# Altium footprint library Connectors SMD.PcbLib: 130 footprints (part 5 of 12) (continued)
## PANASONIC_AYF315115 [mm] "51 Contacts, Pitch 0.3mm, Surface Mount, FPC for FPC Connection, YF31 Serie"
height 0.91
pads (53):
  rect 0.3x0.7 smd: 1(-7.5,-1.15) 3(-6.9,-1.15) 5(-6.3,-1.15) 7(-5.7,-1.15) 9(-5.1,-1.15) 11(-4.5,-1.15) 13(-3.9,-1.15) 15(-3.3,-1.15) 17(-2.7,-1.15) 19(-2.1,-1.15) 21(-1.5,-1.15) 23(-0.9,-1.15) 25(-0.3,-1.15) 27(0.3,-1.15) 29(0.9,-1.15) 31(1.5,-1.15) 33(2.1,-1.15) 35(2.7,-1.15) 37(3.3,-1.15) 39(3.9,-1.15) 41(4.5,-1.15) 43(5.1,-1.15) 45(5.7,-1.15) 47(6.3,-1.15) 49(6.9,-1.15) 51(7.5,-1.15)
  rect 0.3x0.5 smd: 2(-7.2,1.45) 4(-6.6,1.45) 6(-6,1.45) 8(-5.4,1.45) 10(-4.8,1.45) 12(-4.2,1.45) 14(-3.6,1.45) 16(-3,1.45) 18(-2.4,1.45) 20(-1.8,1.45) 22(-1.2,1.45) 24(-0.6,1.45) 26(0,1.45) 28(0.6,1.45) 30(1.2,1.45) 32(1.8,1.45) 34(2.4,1.45) 36(3,1.45) 38(3.6,1.45) 40(4.2,1.45) 42(4.8,1.45) 44(5.4,1.45) 46(6,1.45) 48(6.6,1.45) 50(7.2,1.45)
  rect 0.45x1 smd: 52(8.2,-0.9) 53(-8.2,-0.9)
Top Overlay:
  drawing of 215 lines, arcs and shapes, not listed
Mechanical 8:
  drawing of 269 lines, arcs and shapes, not listed
Mechanical 14:
  drawing of 250 lines, arcs and shapes, not listed
Mechanical 15:
  lines w0.05: -8.925,-1.85 8.925,-1.85 8.925,1.95 -8.925,1.95 -8.925,-1.85
3D body: height 0.9, standoff 0, extent -8.675,-1.6 8.675,1.6

## PCI Express x1 [mm] "36 contacts Board Eddge PCI Express x1 Connector"
pads (36):
  rect 0.7x3.2 smd far side paste-0.4: A1(0.65,4)
  rect 0.7x4 smd far side paste-0.4: A2(1.65,3.6) A3(2.65,3.6) A4(3.65,3.6) A5(4.65,3.6) A6(5.65,3.6) A7(6.65,3.6) A8(7.65,3.6) A9(8.65,3.6) A10(9.65,3.6) A11(10.65,3.6) A12(13.65,3.6) A13(14.65,3.6) A14(15.65,3.6) A15(16.65,3.6) A16(17.65,3.6) A17(18.65,3.6) A18(19.65,3.6)
  rect 0.7x4 smd paste-0.4: B1(0.65,3.6) B2(1.65,3.6) B3(2.65,3.6) B4(3.65,3.6) B5(4.65,3.6) B6(5.65,3.6) B7(6.65,3.6) B8(7.65,3.6) B9(8.65,3.6) B10(9.65,3.6) B11(10.65,3.6) B12(13.65,3.6) B13(14.65,3.6) B14(15.65,3.6) B15(16.65,3.6) B16(17.65,3.6) B18(19.65,3.6)
  rect 0.7x3.2 smd paste-0.4: B17(18.65,4)
Top Overlay:
  text "B18" at 19.989,6.096 h0.76
  text "B12" at 13.989,6.096 h0.76
  text "B11" at 10.889,6.096 h0.76
  text "B1" at 0.889,6.096 h0.76
Bottom Overlay:
  text "A18" at 19.151,6.02 h0.76
  text "A12" at 13.151,6.02 h0.76
  text "A11" at 10.051,6.02 h0.76
  text "A1" at 0.051,6.02 h0.76
Mechanical 8:
  drawing of 164 lines, arcs and shapes, not listed

## PCI Express x4 [mm] "64 contacts Board Eddge PCI Express x4 Connector"
pads (64):
  rect 0.7x3.2 smd far side paste-0.4: A1(0.65,4)
  rect 0.7x4 smd far side paste-0.4: A2(1.65,3.6) A3(2.65,3.6) A4(3.65,3.6) A5(4.65,3.6) A6(5.65,3.6) A7(6.65,3.6) A8(7.65,3.6) A9(8.65,3.6) A10(9.65,3.6) A11(10.65,3.6) A12(13.65,3.6) A13(14.65,3.6) A14(15.65,3.6) A15(16.65,3.6) A16(17.65,3.6) A17(18.65,3.6) A18(19.65,3.6) A19(20.65,3.6) A20(21.65,3.6) A21(22.65,3.6) A22(23.65,3.601) A23(24.65,3.601) A24(25.65,3.601) A25(26.65,3.601) A26(27.65,3.601) A27(28.65,3.601) A28(29.65,3.601) A29(30.65,3.602) A30(31.65,3.602) A31(32.65,3.602) A32(33.65,3.602)
  rect 0.7x4 smd paste-0.4: B1(0.65,3.6) B2(1.65,3.6) B3(2.65,3.6) B4(3.65,3.6) B5(4.65,3.6) B6(5.65,3.6) B7(6.65,3.6) B8(7.65,3.6) B9(8.65,3.6) B10(9.65,3.6) B11(10.65,3.6) B12(13.65,3.6) B13(14.65,3.6) B14(15.65,3.6) B15(16.65,3.6) B16(17.65,3.6) B18(19.65,3.6) B19(20.65,3.6) B20(21.65,3.6) B21(22.65,3.6) B22(23.65,3.601) B23(24.65,3.601) B24(25.65,3.601) B25(26.65,3.601) B26(27.65,3.601) B27(28.65,3.601) B28(29.65,3.601) B29(30.65,3.602) B30(31.65,3.602) B32(33.65,3.602)
  rect 0.7x3.2 smd paste-0.4: B17(18.65,4) B31(32.65,4.002)
Top Overlay:
  text "B1" at 0.889,6.096 h0.76
  text "B11" at 10.889,6.096 h0.76
  text "B12" at 13.989,6.096 h0.76
  text "B18" at 19.989,6.096 h0.76
  text "B32" at 33.989,6.098 h0.76
Bottom Overlay:
  text "A1" at 0.051,6.02 h0.76
  text "A11" at 10.051,6.02 h0.76
  text "A12" at 13.151,6.02 h0.76
  text "A18" at 19.151,6.02 h0.76
  text "A32" at 33.151,6.022 h0.76
Mechanical 8:
  drawing of 280 lines, arcs and shapes, not listed

## PCI Express x8 [mm] "98 contacts Board Eddge PCI Express x8 Connector"
pads (98):
  rect 0.7x3.2 smd far side paste-0.4: A1(0.65,4)
  rect 0.7x4 smd far side paste-0.4: A2(1.65,3.6) A3(2.65,3.6) A4(3.65,3.6) A5(4.65,3.6) A6(5.65,3.6) A7(6.65,3.6) A8(7.65,3.6) A9(8.65,3.6) A10(9.65,3.6) A11(10.65,3.6) A12(13.65,3.6) A13(14.65,3.6) A14(15.65,3.6) A15(16.65,3.6) A16(17.65,3.6) A17(18.65,3.6) A18(19.65,3.6) A19(20.65,3.6) A20(21.65,3.6) A21(22.65,3.6) A22(23.65,3.601) A23(24.65,3.601) A24(25.65,3.601) A25(26.65,3.601) A26(27.65,3.601) A27(28.65,3.601) A28(29.65,3.601) A29(30.65,3.602) A30(31.65,3.602) A31(32.65,3.602) A32(33.65,3.602) A33(34.65,3.602) A34(35.65,3.602) A35(36.65,3.602) A36(37.65,3.602) A37(38.65,3.602) A38(39.65,3.602) A39(40.65,3.602) A40(41.65,3.602) A41(42.65,3.602) A42(43.65,3.602) A43(44.65,3.602) A44(45.65,3.602) A45(46.65,3.602) A46(47.65,3.602) A47(48.65,3.602) A48(49.65,3.602) A49(50.65,3.602)
  rect 0.7x4 smd paste-0.4: B1(0.65,3.6) B2(1.65,3.6) B3(2.65,3.6) B4(3.65,3.6) B5(4.65,3.6) B6(5.65,3.6) B7(6.65,3.6) B8(7.65,3.6) B9(8.65,3.6) B10(9.65,3.6) B11(10.65,3.6) B12(13.65,3.6) B13(14.65,3.6) B14(15.65,3.6) B15(16.65,3.6) B16(17.65,3.6) B18(19.65,3.6) B19(20.65,3.6) B20(21.65,3.6) B21(22.65,3.6) B22(23.65,3.601) B23(24.65,3.601) B24(25.65,3.601) B25(26.65,3.601) B26(27.65,3.601) B27(28.65,3.601) B28(29.65,3.601) B29(30.65,3.602) B30(31.65,3.602) B32(33.65,3.602) B33(34.65,3.602) B34(35.65,3.602) B35(36.65,3.602) B36(37.65,3.602) B37(38.65,3.602) B38(39.65,3.602) B39(40.65,3.602) B40(41.65,3.602) B41(42.65,3.602) B42(43.65,3.602) B43(44.65,3.602) B44(45.65,3.602) B45(46.65,3.602) B46(47.65,3.602) B47(48.65,3.602) B49(50.65,3.602)
  rect 0.7x3.2 smd paste-0.4: B17(18.65,4) B31(32.65,4.002) B48(49.65,4.002)
Top Overlay:
  text "B1" at 0.889,6.096 h0.76
  text "B11" at 10.889,6.096 h0.76
  text "B12" at 13.989,6.096 h0.76
  text "B18" at 19.989,6.096 h0.76
  text "B32" at 33.989,6.098 h0.76
  text "B49" at 50.989,6.098 h0.76
Bottom Overlay:
  text "A1" at 0.051,6.02 h0.76
  text "A11" at 10.051,6.02 h0.76
  text "A12" at 13.151,6.02 h0.76
  text "A18" at 19.151,6.02 h0.76
  text "A32" at 33.151,6.022 h0.76
  text "A49" at 50.151,6.022 h0.76
Mechanical 8:
  drawing of 308 lines, arcs and shapes, not listed

## PCI Express x16 [mm] "164 contacts Board Eddge PCI Express x16 Connector"
pads (164):
  rect 0.7x3.2 smd far side paste-0.4: A1(0.65,4)
  rect 0.7x4 smd far side paste-0.4: A2(1.65,3.6) A3(2.65,3.6) A4(3.65,3.6) A5(4.65,3.6) A6(5.65,3.6) A7(6.65,3.6) A8(7.65,3.6) A9(8.65,3.6) A10(9.65,3.6) A11(10.65,3.6) A12(13.65,3.6) A13(14.65,3.6) A14(15.65,3.6) A15(16.65,3.6) A16(17.65,3.6) A17(18.65,3.6) A18(19.65,3.6) A19(20.65,3.6) A20(21.65,3.6) A21(22.65,3.6) A22(23.65,3.601) A23(24.65,3.601) A24(25.65,3.601) A25(26.65,3.601) A26(27.65,3.601) A27(28.65,3.601) A28(29.65,3.601) A29(30.65,3.602) A30(31.65,3.602) A31(32.65,3.602) A32(33.65,3.602) A33(34.65,3.602) A34(35.65,3.602) A35(36.65,3.602) A36(37.65,3.602) A37(38.65,3.602) A38(39.65,3.602) A39(40.65,3.602) A40(41.65,3.602) A41(42.65,3.602) A42(43.65,3.602) A43(44.65,3.602) A44(45.65,3.602) A45(46.65,3.602) A46(47.65,3.602) A47(48.65,3.602) A48(49.65,3.602) A49(50.65,3.602) A50(51.65,3.602) A51(52.65,3.602) A52(53.65,3.602) A53(54.65,3.602) A54(55.65,3.602) A55(56.65,3.602) A56(57.65,3.602) A57(58.65,3.602) A58(59.65,3.602) A59(60.65,3.602) A60(61.65,3.602) A61(62.65,3.602) A62(63.65,3.602) A63(64.65,3.602) A64(65.65,3.602) A65(66.65,3.602) A66(67.65,3.602) A67(68.65,3.602) A68(69.65,3.602) A69(70.65,3.602) A70(71.65,3.602) A71(72.65,3.602) A72(73.65,3.602) A73(74.65,3.602) A74(75.65,3.602) A75(76.65,3.602) A76(77.65,3.602) A77(78.65,3.602) A78(79.65,3.602) A79(80.65,3.602) A80(81.65,3.602) A81(82.65,3.602) A82(83.65,3.602)
  rect 0.7x4 smd paste-0.4: B1(0.65,3.6) B2(1.65,3.6) B3(2.65,3.6) B4(3.65,3.6) B5(4.65,3.6) B6(5.65,3.6) B7(6.65,3.6) B8(7.65,3.6) B9(8.65,3.6) B10(9.65,3.6) B11(10.65,3.6) B12(13.65,3.6) B13(14.65,3.6) B14(15.65,3.6) B15(16.65,3.6) B16(17.65,3.6) B18(19.65,3.6) B19(20.65,3.6) B20(21.65,3.6) B21(22.65,3.6) B22(23.65,3.601) B23(24.65,3.601) B24(25.65,3.601) B25(26.65,3.601) B26(27.65,3.601) B27(28.65,3.601) B28(29.65,3.601) B29(30.65,3.602) B30(31.65,3.602) B32(33.65,3.602) B33(34.65,3.602) B34(35.65,3.602) B35(36.65,3.602) B36(37.65,3.602) B37(38.65,3.602) B38(39.65,3.602) B39(40.65,3.602) B40(41.65,3.602) B41(42.65,3.602) B42(43.65,3.602) B43(44.65,3.602) B44(45.65,3.602) B45(46.65,3.602) B46(47.65,3.602) B47(48.65,3.602) B49(50.65,3.602) B50(51.65,3.602) B51(52.65,3.602) B52(53.65,3.602) B53(54.65,3.602) B54(55.65,3.602) B55(56.65,3.602) B56(57.65,3.602) B57(58.65,3.602) B58(59.65,3.602) B59(60.65,3.602) B60(61.65,3.602) B61(62.65,3.602) B62(63.65,3.602) B63(64.65,3.602) B64(65.65,3.602) B65(66.65,3.602) B66(67.65,3.602) B67(68.65,3.602) B68(69.65,3.602) B69(70.65,3.602) B70(71.65,3.602) B71(72.65,3.602) B72(73.65,3.602) B73(74.65,3.602) B74(75.65,3.602) B75(76.65,3.602) B76(77.65,3.602) B77(78.65,3.602) B78(79.65,3.602) B79(80.65,3.602) B80(81.65,3.602) B82(83.65,3.602)
  rect 0.7x3.2 smd paste-0.4: B17(18.65,4) B31(32.65,4.002) B48(49.65,4.002) B81(82.65,4.002)
Top Overlay:
  text "B82" at 83.989,6.098 h0.76
  text "B49" at 50.989,6.098 h0.76
  text "B32" at 33.989,6.098 h0.76
  text "B18" at 19.989,6.096 h0.76
  text "B12" at 13.989,6.096 h0.76
  text "B11" at 10.889,6.096 h0.76
  text "B1" at 0.889,6.096 h0.76
Bottom Overlay:
  text "A82" at 83.151,6.022 h0.76
  text "A49" at 50.151,6.022 h0.76
  text "A32" at 33.151,6.022 h0.76
  text "A18" at 19.151,6.02 h0.76
  text "A12" at 13.151,6.02 h0.76
  text "A11" at 10.051,6.02 h0.76
  text "A1" at 0.051,6.02 h0.76
Mechanical 8:
  drawing of 328 lines, arcs and shapes, not listed

## SAMTEC_ASP-127797-01 [mm] "Connector VITA 57, 160 Male contacts in 4 row cdgh"
height 6.1
pads (162):
  round 1 hole 1.3 unplated mask+0.3: 1(-27.191,-3.048) 2(27.191,0)
  round 0.64 smd: c1(24.765,3.175) c2(23.495,3.175) c3(22.225,3.175) c4(20.955,3.175) c5(19.685,3.175) c6(18.415,3.175) c7(17.145,3.175) c8(15.875,3.175) c9(14.605,3.175) c10(13.335,3.175) c11(12.065,3.175) c12(10.795,3.175) c13(9.525,3.175) c14(8.255,3.175) c15(6.985,3.175) c16(5.715,3.175) c17(4.445,3.175) c18(3.175,3.175) c19(1.905,3.175) c20(0.635,3.175) c21(-0.635,3.175) c22(-1.905,3.175) c23(-3.175,3.175) c24(-4.445,3.175) c25(-5.715,3.175) c26(-6.985,3.175) c27(-8.255,3.175) c28(-9.525,3.175) c29(-10.795,3.175) c30(-12.065,3.175) c31(-13.335,3.175) c32(-14.605,3.175) c33(-15.875,3.175) c34(-17.145,3.175) c35(-18.415,3.175) c36(-19.685,3.175) c37(-20.955,3.175) c38(-22.225,3.175) c39(-23.495,3.175) c40(-24.765,3.175) d1(24.765,1.905) d2(23.495,1.905) d3(22.225,1.905) d4(20.955,1.905) d5(19.685,1.905) d6(18.415,1.905) d7(17.145,1.905) d8(15.875,1.905) d9(14.605,1.905) d10(13.335,1.905) d11(12.065,1.905) d12(10.795,1.905) d13(9.525,1.905) d14(8.255,1.905) d15(6.985,1.905) d16(5.715,1.905) d17(4.445,1.905) d18(3.175,1.905) d19(1.905,1.905) d20(0.635,1.905) d21(-0.635,1.905) d22(-1.905,1.905) d23(-3.175,1.905) d24(-4.445,1.905) d25(-5.715,1.905) d26(-6.985,1.905) d27(-8.255,1.905) d28(-9.525,1.905) d29(-10.795,1.905) d30(-12.065,1.905) d31(-13.335,1.905) d32(-14.605,1.905) d33(-15.875,1.905) d34(-17.145,1.905) d35(-18.415,1.905) d36(-19.685,1.905) d37(-20.955,1.905) d38(-22.225,1.905) d39(-23.495,1.905) d40(-24.765,1.905) g1(24.765,-1.905) g2(23.495,-1.905) g3(22.225,-1.905) g4(20.955,-1.905) g5(19.685,-1.905) g6(18.415,-1.905) g7(17.145,-1.905) g8(15.875,-1.905) g9(14.605,-1.905) g10(13.335,-1.905) g11(12.065,-1.905) g12(10.795,-1.905) g13(9.525,-1.905) g14(8.255,-1.905) g15(6.985,-1.905) g16(5.715,-1.905) g17(4.445,-1.905) g18(3.175,-1.905) g19(1.905,-1.905) g20(0.635,-1.905) g21(-0.635,-1.905) g22(-1.905,-1.905) g23(-3.175,-1.905) g24(-4.445,-1.905) g25(-5.715,-1.905) g26(-6.985,-1.905) g27(-8.255,-1.905) g28(-9.525,-1.905) g29(-10.795,-1.905) g30(-12.065,-1.905) g31(-13.335,-1.905) g32(-14.605,-1.905) g33(-15.875,-1.905) g34(-17.145,-1.905) g35(-18.415,-1.905) g36(-19.685,-1.905) g37(-20.955,-1.905) g38(-22.225,-1.905) g39(-23.495,-1.905) g40(-24.765,-1.905) h1(24.765,-3.175) h2(23.495,-3.175) h3(22.225,-3.175) h4(20.955,-3.175) h5(19.685,-3.175) h6(18.415,-3.175) h7(17.145,-3.175) h8(15.875,-3.175) h9(14.605,-3.175) h10(13.335,-3.175) h11(12.065,-3.175) h12(10.795,-3.175) h13(9.525,-3.175) h14(8.255,-3.175) h15(6.985,-3.175) h16(5.715,-3.175) h17(4.445,-3.175) h18(3.175,-3.175) h19(1.905,-3.175) h20(0.635,-3.175) h21(-0.635,-3.175) h22(-1.905,-3.175) h23(-3.175,-3.175) h24(-4.445,-3.175) h25(-5.715,-3.175) h26(-6.985,-3.175) h27(-8.255,-3.175) h28(-9.525,-3.175) h29(-10.795,-3.175) h30(-12.065,-3.175) h31(-13.335,-3.175) h32(-14.605,-3.175) h33(-15.875,-3.175) h34(-17.145,-3.175) h35(-18.415,-3.175) h36(-19.685,-3.175) h37(-20.955,-3.175) h38(-22.225,-3.175) h39(-23.495,-3.175) h40(-24.765,-3.175)
Top Overlay:
  drawing of 605 lines, arcs and shapes, not listed
  text "1" at 25.417,-8.073 h1
  text "40" at -27.305,-7.112 h1
  text "g" at 29.862,-2.231 h1
  text "h" at 29.972,-3.556 h1
  text "c" at 29.972,2.921 h1
  text "d" at 29.989,1.545 h1
Mechanical 8:
  drawing of 648 lines, arcs and shapes, not listed
Mechanical 14:
  drawing of 4433 lines, arcs and shapes, not listed
  text "1" at 25.417,-8.073 h1
  text "40" at -27.305,-7.112 h1
  text "g" at 29.862,-2.231 h1
  text "h" at 29.972,-3.556 h1
  text "d" at 29.989,1.545 h1
  text "c" at 29.972,2.921 h1
3D body: height 5.61, standoff -1.27, extent -27.889,-7.341 28.778,7.341

## SAMTEC_ASP-134486-01 [mm] "Connector VITA 57, 400 Female contacts in 10 row abcdefghj"
height 6.55
pads (402):
  round 1 hole 1.3 unplated mask+0.3: 1(-27.19,0) 2(27.19,-3.05)
  round 0.64 smd: a1(24.765,-5.715) a2(23.495,-5.715) a3(22.225,-5.715) a4(20.955,-5.715) a5(19.685,-5.715) a6(18.415,-5.715) a7(17.145,-5.715) a8(15.875,-5.715) a9(14.605,-5.715) a10(13.335,-5.715) a11(12.065,-5.715) a12(10.795,-5.715) a13(9.525,-5.715) a14(8.255,-5.715) a15(6.985,-5.715) a16(5.715,-5.715) a17(4.445,-5.715) a18(3.175,-5.715) a19(1.905,-5.715) a20(0.635,-5.715) a21(-0.635,-5.715) a22(-1.905,-5.715) a23(-3.175,-5.715) a24(-4.445,-5.715) a25(-5.715,-5.715) a26(-6.985,-5.715) a27(-8.255,-5.715) a28(-9.525,-5.715) a29(-10.795,-5.715) a30(-12.065,-5.715) a31(-13.335,-5.715) a32(-14.605,-5.715) a33(-15.875,-5.715) a34(-17.145,-5.715) a35(-18.415,-5.715) a36(-19.685,-5.715) a37(-20.955,-5.715) a38(-22.225,-5.715) a39(-23.495,-5.715) a40(-24.765,-5.715) b1(24.765,-4.445) b2(23.495,-4.445) b3(22.225,-4.445) b4(20.955,-4.445) b5(19.685,-4.445) b6(18.415,-4.445) b7(17.145,-4.445) b8(15.875,-4.445) b9(14.605,-4.445) b10(13.335,-4.445) b11(12.065,-4.445) b12(10.795,-4.445) b13(9.525,-4.445) b14(8.255,-4.445) b15(6.985,-4.445) b16(5.715,-4.445) b17(4.445,-4.445) b18(3.175,-4.445) b19(1.905,-4.445) b20(0.635,-4.445) b21(-0.635,-4.445) b22(-1.905,-4.445) b23(-3.175,-4.445) b24(-4.445,-4.445) b25(-5.715,-4.445) b26(-6.985,-4.445) b27(-8.255,-4.445) b28(-9.525,-4.445) b29(-10.795,-4.445) b30(-12.065,-4.445) b31(-13.335,-4.445) b32(-14.605,-4.445) b33(-15.875,-4.445) b34(-17.145,-4.445) b35(-18.415,-4.445) b36(-19.685,-4.445) b37(-20.955,-4.445) b38(-22.225,-4.445) b39(-23.495,-4.445) b40(-24.765,-4.445) c1(24.765,-3.175) c2(23.495,-3.175) c3(22.225,-3.175) c4(20.955,-3.175) c5(19.685,-3.175) c6(18.415,-3.175) c7(17.145,-3.175) c8(15.875,-3.175) c9(14.605,-3.175) c10(13.335,-3.175) c11(12.065,-3.175) c12(10.795,-3.175) c13(9.525,-3.175) c14(8.255,-3.175) c15(6.985,-3.175) c16(5.715,-3.175) c17(4.445,-3.175) c18(3.175,-3.175) c19(1.905,-3.175) c20(0.635,-3.175) c21(-0.635,-3.175) c22(-1.905,-3.175) c23(-3.175,-3.175) c24(-4.445,-3.175) c25(-5.715,-3.175) c26(-6.985,-3.175) c27(-8.255,-3.175) c28(-9.525,-3.175) c29(-10.795,-3.175) c30(-12.065,-3.175) c31(-13.335,-3.175) c32(-14.605,-3.175) c33(-15.875,-3.175) c34(-17.145,-3.175) c35(-18.415,-3.175) c36(-19.685,-3.175) c37(-20.955,-3.175) c38(-22.225,-3.175) c39(-23.495,-3.175) c40(-24.765,-3.175) d1(24.765,-1.905) d2(23.495,-1.905) d3(22.225,-1.905) d4(20.955,-1.905) d5(19.685,-1.905) d6(18.415,-1.905) d7(17.145,-1.905) d8(15.875,-1.905) d9(14.605,-1.905) d10(13.335,-1.905) d11(12.065,-1.905) d12(10.795,-1.905) d13(9.525,-1.905) d14(8.255,-1.905) d15(6.985,-1.905) d16(5.715,-1.905) d17(4.445,-1.905) d18(3.175,-1.905) d19(1.905,-1.905) d20(0.635,-1.905) d21(-0.635,-1.905) d22(-1.905,-1.905) d23(-3.175,-1.905) d24(-4.445,-1.905) d25(-5.715,-1.905) d26(-6.985,-1.905) d27(-8.255,-1.905) d28(-9.525,-1.905) d29(-10.795,-1.905) d30(-12.065,-1.905) d31(-13.335,-1.905) d32(-14.605,-1.905) d33(-15.875,-1.905) d34(-17.145,-1.905) d35(-18.415,-1.905) d36(-19.685,-1.905) d37(-20.955,-1.905) d38(-22.225,-1.905) d39(-23.495,-1.905) d40(-24.765,-1.905) e1(24.765,-0.635) e2(23.495,-0.635) e3(22.225,-0.635) e4(20.955,-0.635) e5(19.685,-0.635) e6(18.415,-0.635) e7(17.145,-0.635) e8(15.875,-0.635) e9(14.605,-0.635) e10(13.335,-0.635) e11(12.065,-0.635) e12(10.795,-0.635) e13(9.525,-0.635) e14(8.255,-0.635) e15(6.985,-0.635) e16(5.715,-0.635) e17(4.445,-0.635) e18(3.175,-0.635) e19(1.905,-0.635) e20(0.635,-0.635) e21(-0.635,-0.635) e22(-1.905,-0.635) e23(-3.175,-0.635) e24(-4.445,-0.635) e25(-5.715,-0.635) e26(-6.985,-0.635) e27(-8.255,-0.635) e28(-9.525,-0.635) e29(-10.795,-0.635) e30(-12.065,-0.635) e31(-13.335,-0.635) e32(-14.605,-0.635) e33(-15.875,-0.635) e34(-17.145,-0.635) e35(-18.415,-0.635) e36(-19.685,-0.635) e37(-20.955,-0.635) e38(-22.225,-0.635) e39(-23.495,-0.635) e40(-24.765,-0.635) f1(24.765,0.635) f2(23.495,0.635) f3(22.225,0.635) f4(20.955,0.635) f5(19.685,0.635) f6(18.415,0.635) f7(17.145,0.635) f8(15.875,0.635) f9(14.605,0.635) f10(13.335,0.635) f11(12.065,0.635) f12(10.795,0.635) f13(9.525,0.635) f14(8.255,0.635) f15(6.985,0.635) f16(5.715,0.635) f17(4.445,0.635) f18(3.175,0.635) f19(1.905,0.635) f20(0.635,0.635) f21(-0.635,0.635) f22(-1.905,0.635) f23(-3.175,0.635) f24(-4.445,0.635) f25(-5.715,0.635) f26(-6.985,0.635) f27(-8.255,0.635) f28(-9.525,0.635) f29(-10.795,0.635) f30(-12.065,0.635) f31(-13.335,0.635) f32(-14.605,0.635) f33(-15.875,0.635) f34(-17.145,0.635) f35(-18.415,0.635) f36(-19.685,0.635) f37(-20.955,0.635) f38(-22.225,0.635) f39(-23.495,0.635) f40(-24.765,0.635) g1(24.765,1.905) g2(23.495,1.905) g3(22.225,1.905) g4(20.955,1.905) g5(19.685,1.905) g6(18.415,1.905) g7(17.145,1.905) g8(15.875,1.905) g9(14.605,1.905) g10(13.335,1.905) g11(12.065,1.905) g12(10.795,1.905) g13(9.525,1.905) g14(8.255,1.905) g15(6.985,1.905) g16(5.715,1.905) g17(4.445,1.905) g18(3.175,1.905) g19(1.905,1.905) g20(0.635,1.905) g21(-0.635,1.905) g22(-1.905,1.905) g23(-3.175,1.905) g24(-4.445,1.905) g25(-5.715,1.905) g26(-6.985,1.905) g27(-8.255,1.905) g28(-9.525,1.905) g29(-10.795,1.905) g30(-12.065,1.905) g31(-13.335,1.905) g32(-14.605,1.905) g33(-15.875,1.905) g34(-17.145,1.905) g35(-18.415,1.905) g36(-19.685,1.905) g37(-20.955,1.905) g38(-22.225,1.905) g39(-23.495,1.905) g40(-24.765,1.905) h1(24.765,3.175) h2(23.495,3.175) h3(22.225,3.175) h4(20.955,3.175) h5(19.685,3.175) h6(18.415,3.175) h7(17.145,3.175) h8(15.875,3.175) h9(14.605,3.175) h10(13.335,3.175) h11(12.065,3.175) h12(10.795,3.175) h13(9.525,3.175) h14(8.255,3.175) h15(6.985,3.175) h16(5.715,3.175) h17(4.445,3.175) h18(3.175,3.175) h19(1.905,3.175) h20(0.635,3.175) h21(-0.635,3.175) h22(-1.905,3.175) h23(-3.175,3.175) h24(-4.445,3.175) h25(-5.715,3.175) h26(-6.985,3.175) h27(-8.255,3.175) h28(-9.525,3.175) h29(-10.795,3.175) h30(-12.065,3.175) h31(-13.335,3.175) h32(-14.605,3.175) h33(-15.875,3.175) h34(-17.145,3.175) h35(-18.415,3.175) h36(-19.685,3.175) h37(-20.955,3.175) h38(-22.225,3.175) h39(-23.495,3.175) h40(-24.765,3.175) j1(24.765,4.445) j2(23.495,4.445) j3(22.225,4.445) j4(20.955,4.445) j5(19.685,4.445) j6(18.415,4.445) j7(17.145,4.445) j8(15.875,4.445) j9(14.605,4.445) j10(13.335,4.445) j11(12.065,4.445) j12(10.795,4.445) j13(9.525,4.445) j14(8.255,4.445) j15(6.985,4.445) j16(5.715,4.445) j17(4.445,4.445) j18(3.175,4.445) j19(1.905,4.445) j20(0.635,4.445) j21(-0.635,4.445) j22(-1.905,4.445) j23(-3.175,4.445) j24(-4.445,4.445) j25(-5.715,4.445) j26(-6.985,4.445) j27(-8.255,4.445) j28(-9.525,4.445) j29(-10.795,4.445) j30(-12.065,4.445) j31(-13.335,4.445) j32(-14.605,4.445) j33(-15.875,4.445) j34(-17.145,4.445) j35(-18.415,4.445) j36(-19.685,4.445) j37(-20.955,4.445) j38(-22.225,4.445) j39(-23.495,4.445) j40(-24.765,4.445) k1(24.765,5.715) k2(23.495,5.715) k3(22.225,5.715) k4(20.955,5.715) k5(19.685,5.715) k6(18.415,5.715) k7(17.145,5.715) k8(15.875,5.715) k9(14.605,5.715) k10(13.335,5.715) k11(12.065,5.715) k12(10.795,5.715) k13(9.525,5.715) k14(8.255,5.715) k15(6.985,5.715) k16(5.715,5.715) k17(4.445,5.715) k18(3.175,5.715) k19(1.905,5.715) k20(0.635,5.715) k21(-0.635,5.715) k22(-1.905,5.715) k23(-3.175,5.715) k24(-4.445,5.715) k25(-5.715,5.715) k26(-6.985,5.715) k27(-8.255,5.715) k28(-9.525,5.715) k29(-10.795,5.715) k30(-12.065,5.715) k31(-13.335,5.715) k32(-14.605,5.715) k33(-15.875,5.715) k34(-17.145,5.715) k35(-18.415,5.715) k36(-19.685,5.715) k37(-20.955,5.715) k38(-22.225,5.715) k39(-23.495,5.715) k40(-24.765,5.715)
Top Overlay:
  lines w0.2: -27.889,-1.213 -27.889,-2.197 -28.727,-2.197 -28.727,-6.617 27.889,-6.617 27.889,-4.263 ; -27.889,1.213 -27.889,2.197 -28.727,2.197 -28.727,6.617 27.889,6.617 27.889,2.845 28.727,2.845 28.727,-2.845 28.575,-2.845 ; -27.305,-1.395 -27.305,-2.477 ; -27.305,1.395 -27.305,2.476 ; -27.051,-1.393 -27.051,-2.858 ; -27.051,1.393 -27.051,2.857 ; -25.5,-5.855 -28.067,-5.855 ; -25.5,5.855 -28.067,5.855 ; -24.994,-6.236 -28.448,-6.236 ; -24.994,6.236 -28.448,6.236 ; 25.2,-6.109 27.305,-6.109 ; 25.2,6.109 27.305,6.109 ; 27.051,-4.443 27.051,-5.855 27.305,-6.109 ; 27.305,-4.445 27.305,-6.109 ; 28.067,-1.959 28.067,2.184 ; 28.448,-2.436 28.448,2.565 ; -28.448,-6.236 -28.448,-2.477 ; -28.448,-6.236 -28.067,-5.855 ; -28.448,-2.477 -27.305,-2.477 ; -28.448,-2.477 -28.067,-2.858 ; -28.448,2.476 -28.448,6.236 ; -28.448,2.476 -27.305,2.476 ; -28.448,2.476 -28.067,2.857 ; -28.448,6.236 -28.067,5.855 ; -28.067,-5.855 -28.067,-2.858 ; -28.067,-2.858 -27.051,-2.858 ; -28.067,2.857 -27.051,2.857 ; -28.067,2.857 -28.067,5.855 ; -27.305,-2.477 -27.051,-2.858 ; -27.305,2.476 -27.051,2.857 ; 27.051,2.184 27.051,5.855 27.305,6.109 ; 27.051,2.184 28.067,2.184 ; 27.051,2.184 27.305,2.565 ; 27.305,2.565 28.448,2.565 ; 27.305,2.565 27.305,6.109 ; 28.067,2.184 28.448,2.565
  text "e" at 29.949,-0.836 h1
  text "d" at 29.989,-2.392 h1
  text "c" at 29.972,-3.556 h1
  text "b" at 29.972,-4.826 h1
  text "a" at 29.972,-6.096 h1
  text "f" at 30.116,0.436 h1
  text "h" at 29.972,2.921 h1
  text "g" at 29.862,1.579 h1
  text "j" at 29.989,4.246 h1
  text "k" at 29.989,5.516 h1
  text "40" at -26.289,-5.461 h1.2
  text "1" at 25.29,-7.438 h1
Mechanical 8:
  drawing of 1618 lines, arcs and shapes, not listed
Mechanical 14:
  drawing of 1424 lines, arcs and shapes, not listed
  text "a" at 29.972,-6.096 h1
  text "b" at 29.972,-4.826 h1
  text "c" at 29.972,-3.556 h1
  text "d" at 29.989,-2.392 h1
  text "e" at 29.949,-0.836 h1
  text "f" at 30.116,0.436 h1
  text "h" at 29.972,2.921 h1
  text "g" at 29.862,1.579 h1
  text "j" at 29.989,4.246 h1
  text "k" at 29.989,5.516 h1
  text "40" at -26.289,-5.461 h1.2
  text "1" at 25.29,-7.438 h1
3D body: height 6.55, standoff -1.27, extent -28.727,-6.618 28.727,6.618